# Altium footprint library circuits integres.PcbLib: 97 footprints (part 2 of 7)
Each footprint in its own frame and in the unit in brackets; x right, y up, seen from the top. Pads: shape width x height; smd on the part's side, far side on the other; paste and mask are expansions set on the pad; w line width, h text height; cw(c..) or ccw(c..) is an arc to the next point about the centre after c.
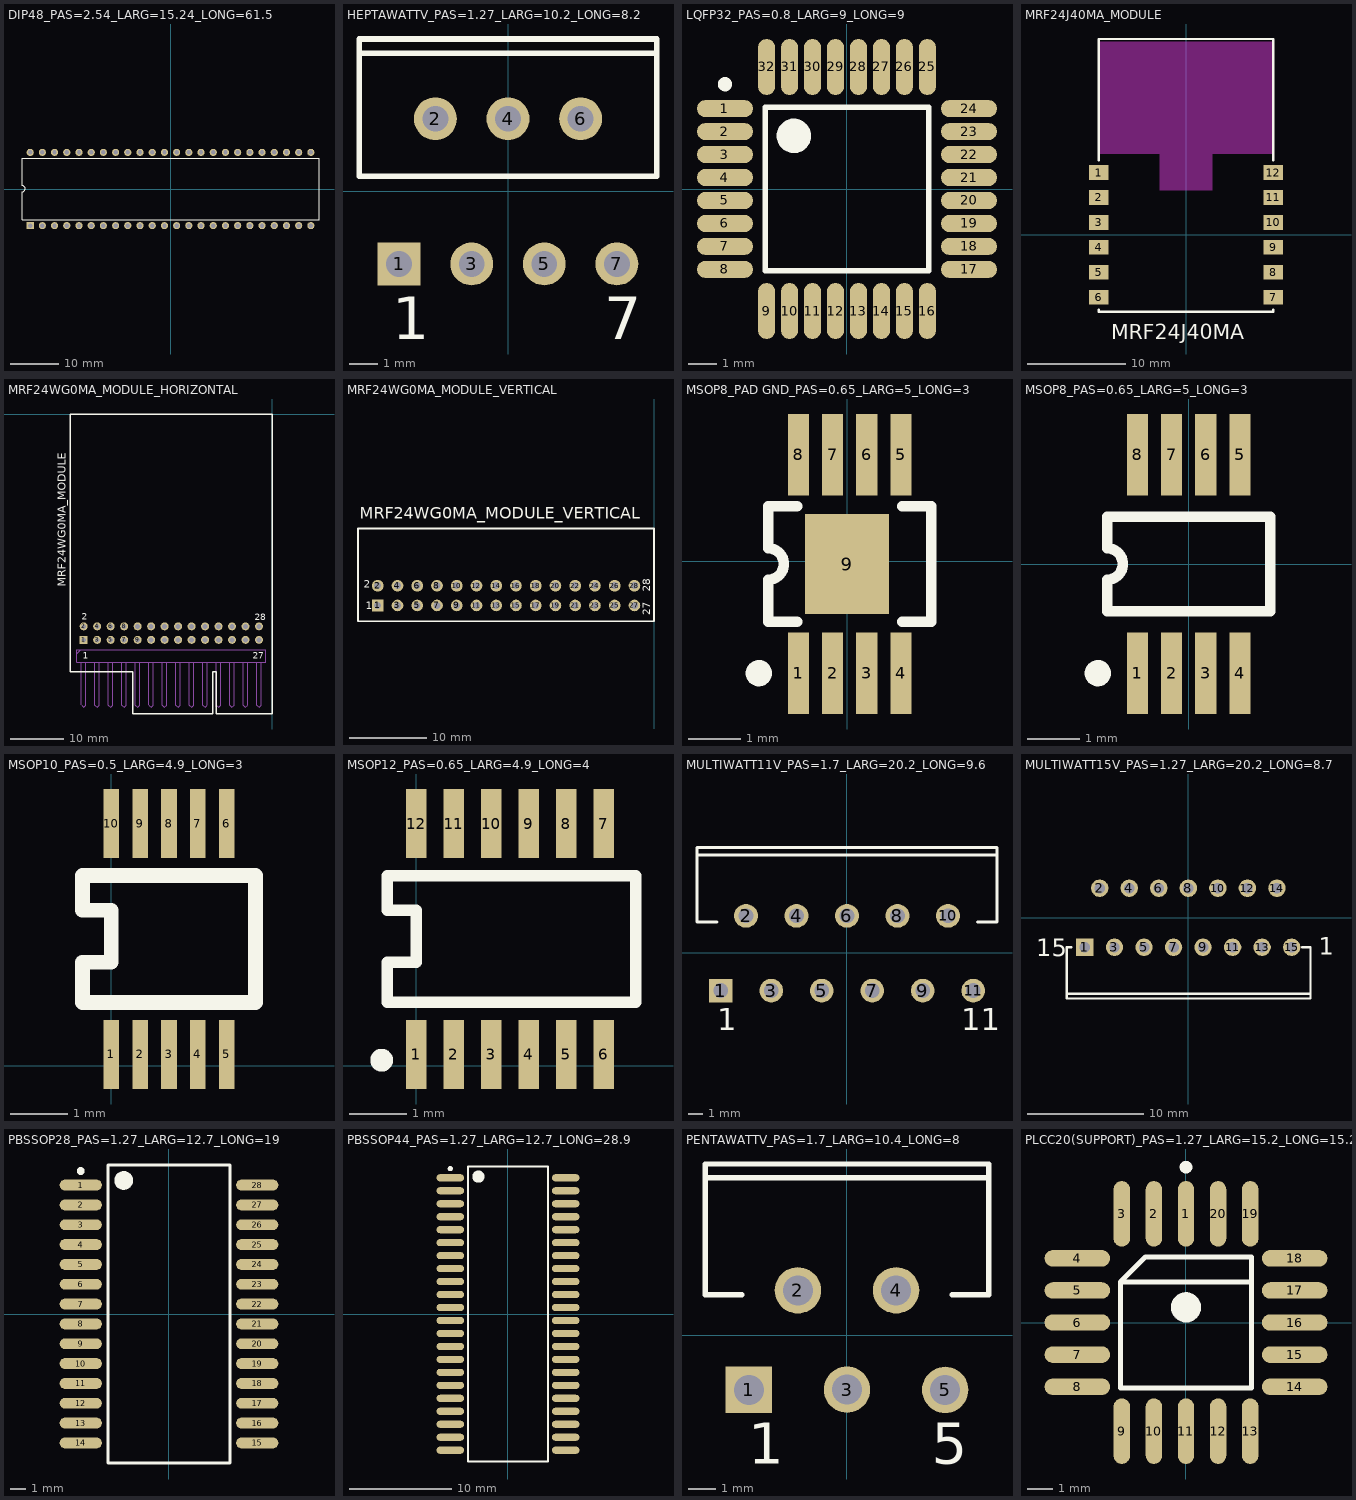
[diagram p1: the footprints below, top view; thin cyan lines are the x and y axes]

## DIP48_PAS=2.54_LARG=15.24_LONG=61.5 [mm] "Dual-In-Line Plastic Packages (PDIP) ; 48 Leads ; Row Spacing = 15.24 mm ; Pitch = 2.54 mm"
height 5
pads (48):
  rect 1.5x1.5 hole 0.9: 1(-29.21,-7.62)
  round 1.5 hole 0.9: 2(-26.67,-7.62) 3(-24.13,-7.62) 4(-21.59,-7.62) 5(-19.05,-7.62) 6(-16.51,-7.62) 7(-13.97,-7.62) 8(-11.43,-7.62) 9(-8.89,-7.62) 10(-6.35,-7.62) 11(-3.81,-7.62) 12(-1.27,-7.62) 13(1.27,-7.62) 14(3.81,-7.62) 15(6.35,-7.62) 16(8.89,-7.62) 17(11.43,-7.62) 18(13.97,-7.62) 19(16.51,-7.62) 20(19.05,-7.62) 21(21.59,-7.62) 22(24.13,-7.62) 23(26.67,-7.62) 24(29.21,-7.62) 25(29.21,7.62) 26(26.67,7.62) 27(24.13,7.62) 28(21.59,7.62) 29(19.05,7.62) 30(16.51,7.62) 31(13.97,7.62) 32(11.43,7.62) 33(8.89,7.62) 34(6.35,7.62) 35(3.81,7.62) 36(1.27,7.62) 37(-1.27,7.62) 38(-3.81,7.62) 39(-6.35,7.62) 40(-8.89,7.62) 41(-11.43,7.62) 42(-13.97,7.62) 43(-16.51,7.62) 44(-19.05,7.62) 45(-21.59,7.62) 46(-24.13,7.62) 47(-26.67,7.62) 48(-29.21,7.62)
Top Overlay:
  lines w0.2: -30.9,-6.45 30.9,-6.45 30.9,6.45 -30.9,6.45 -30.9,1.285 -30.9,0.7 cw(c-30.9,0.065) -30.9,-0.57 -30.9,-1.285 -30.9,-6.45
3D body: height 4.66, standoff -3.28, extent -30.745,-7.82 30.745,7.8

## HEPTAWATTV_PAS=1.27_LARG=10.2_LONG=8.2 [mm] "TO ; Thru-Hole ; Vertical ; Heatsink Mounted ; 7 Bent Staggered Leads ; Pitch = 1.27 mm"
height 20.2
pads (7):
  rect 1.5x1.5 hole 0.9: 1(-3.81,-2.54)
  round 1.5 hole 0.9: 2(-2.54,2.54) 3(-1.27,-2.54) 4(0,2.54) 5(1.27,-2.54) 6(2.54,2.54) 7(3.81,-2.54)
Top Overlay:
  lines w0.2: -5.2,4.83 5.2,4.83 ; -5.2,0.53 5.2,0.53 5.2,5.33 -5.2,5.33 -5.2,0.53
  text "7" at 3.37,-5.165 h1.5
  text "1" at -4.05,-5.165 h1.5
3D body: height 19.5, standoff -1.7, extent -5.1,-2.89 5.1,5.29

## LQFP32_PAS=0.8_LARG=9_LONG=9 [mm] "Low Plastic Quad Flatpack Packages ; 32 Leads ; Body 7mm x 7mm ; Pitch = 0.8mm ; IPC Low Density"
height 1.6
pads (32):
  oval 1.95x0.6 smd: 1(-4.25,2.8) 2(-4.25,2) 3(-4.25,1.2) 4(-4.25,0.4) 5(-4.25,-0.4) 6(-4.25,-1.2) 7(-4.25,-2) 8(-4.25,-2.8) 17(4.25,-2.8) 18(4.25,-2) 19(4.25,-1.2) 20(4.25,-0.4) 21(4.25,0.4) 22(4.25,1.2) 23(4.25,2) 24(4.25,2.8)
  oval 0.6x1.95 smd: 9(-2.8,-4.25) 10(-2,-4.25) 11(-1.2,-4.25) 12(-0.4,-4.25) 13(0.4,-4.25) 14(1.2,-4.25) 15(2,-4.25) 16(2.8,-4.25) 25(2.8,4.25) 26(2,4.25) 27(1.2,4.25) 28(0.4,4.25) 29(-0.4,4.25) 30(-1.2,4.25) 31(-2,4.25) 32(-2.8,4.25)
Top Overlay:
  circle w0.25: c-4.25,3.65 r0.125
  circle w0.6: c-1.85,1.85 r0.3
  lines w0.2: -2.85,-2.85 -2.85,2.85 2.85,2.85 2.85,-2.85 -2.85,-2.85
3D body: height 1.53, standoff -0.19, extent -4.5,-4.5 4.5,4.5

## MRF24J40MA_MODULE [mm]
pads (12):
  rect 2x1.5 smd: 1(-8.89,6.35) 2(-8.89,3.81) 3(-8.89,1.27) 4(-8.89,-1.27) 5(-8.89,-3.81) 6(-8.89,-6.35) 7(8.89,-6.35) 8(8.89,-3.81) 9(8.89,-1.27) 10(8.89,1.27) 11(8.89,3.81) 12(8.89,6.35)
Top Overlay:
  lines w0.254: -8.89,-7.62 -8.89,-7.85 8.89,-7.85 8.89,-7.62 ; -8.89,7.62 -8.89,19.95 8.89,19.95 8.89,7.62
  text "MRF24J40MA" at -7.6,-10.6 h1.52
Keep-Out Layer:
  rectangle: -2.7,4.5 2.7,9.525
  rectangle: -8.89,8.255 8.89,19.685
3D body: height 1.7, standoff 0, extent -8.891,-7.874 8.891,20.066

## MRF24WG0MA_MODULE_HORIZONTAL [mm]
height 5
pads (28):
  rect 1.5x1.5 hole 0.9: 1(-35.5,-42.54)
  round 1.5 hole 0.9: 2(-35.5,-40) 3(-32.96,-42.54) 4(-32.96,-40) 5(-30.42,-42.54) 6(-30.42,-40) 7(-27.88,-42.54) 8(-27.88,-40) 9(-25.34,-42.54) 10(-25.34,-40) 11(-22.8,-42.54) 12(-22.8,-40) 13(-20.26,-42.54) 14(-20.26,-40) 15(-17.72,-42.54) 16(-17.72,-40) 17(-15.18,-42.54) 18(-15.18,-40) 19(-12.64,-42.54) 20(-12.64,-40) 21(-10.1,-42.54) 22(-10.1,-40) 23(-7.56,-42.54) 24(-7.56,-40) 25(-5.02,-42.54) 26(-5.02,-40) 27(-2.48,-42.54) 28(-2.48,-40)
Top Overlay:
  lines w0.254: -38,-48.5 -26.3,-48.5 -26.3,-56.5 -11.23,-56.5 -11.23,-48.5 -10.5,-48.5 -10.5,-56.5 0,-56.5 0,0 -38,0 -38,-48.5
  text "2" at -35.9,-38.74 h1.27
  text "1" at -35.7,-46.14 h1.27
  text "27" at -3.7,-46.14 h1.27
  text "28" at -3.3,-38.84 h1.27
  text "MRF24WG0MA_MODULE" at -38.862,-32.512 h1.52
Mechanical 1:
  lines w0.2: -36.77,-45.145 -36.135,-44.51 ; -35.923,-54.8 -35.923,-46.74 ; -35.903,-54.84 -35.497,-55.247 -35.077,-54.827 -35.077,-46.74 ; -33.383,-46.74 -33.383,-54.867 -32.975,-55.275 -32.537,-54.837 -32.537,-46.84 ; -30.843,-46.74 -30.843,-54.8 -30.843,-54.857 -30.425,-55.275 -29.997,-54.847 -29.997,-46.74 ; -28.303,-46.74 -28.303,-54.84 -27.88,-55.263 -27.457,-54.84 -27.457,-46.74 ; -25.763,-46.74 -25.763,-54.83 -25.33,-55.263 -24.917,-54.85 -24.917,-46.74 ; -23.223,-54.8 -23.223,-46.74 ; -23.203,-54.84 -22.78,-55.263 -22.377,-54.86 -22.377,-46.74 ; -20.683,-46.74 -20.683,-54.8 -20.683,-54.86 -20.28,-55.263 -19.837,-54.82 -19.837,-46.74 ; -18.143,-46.74 -18.143,-54.85 -17.73,-55.263 -17.297,-54.83 -17.297,-46.74 ; -15.603,-46.74 -15.603,-54.84 -15.18,-55.263 -14.757,-54.84 -14.757,-46.74 ; -13.063,-46.74 -13.063,-54.83 -12.63,-55.263 -12.207,-54.84 ; -12.217,-54.8 -12.217,-46.74 ; -10.523,-55 -10.523,-46.74 ; -10.503,-54.84 -10.08,-55.263 -9.677,-54.86 -9.677,-46.74 ; -7.983,-46.74 -7.983,-54.86 -7.58,-55.263 -7.137,-54.82 -7.137,-46.74 ; -5.443,-46.74 -5.443,-54.85 -5.03,-55.263 -4.6,-54.833 ; -4.597,-54.797 -4.597,-46.74 ; -2.903,-54.85 -2.903,-46.74 ; -2.903,-54.84 -2.48,-55.263 -2.057,-54.84 ; -2.057,-54.85 -2.057,-46.74 ; -36.77,-46.74 -1.21,-46.74 -1.21,-44.44 -36.77,-44.44 -36.77,-46.74
3D body: height 5.64, standoff -2.23, extent -36.8,-52.44 -1.24,-39.676

## MRF24WG0MA_MODULE_VERTICAL [mm]
height 5
pads (28):
  rect 1.5x1.5 hole 0.9: 1(-35.56,-42.672)
  round 1.5 hole 0.9: 2(-35.56,-40.132) 3(-33.02,-42.672) 4(-33.02,-40.132) 5(-30.48,-42.672) 6(-30.48,-40.132) 7(-27.94,-42.672) 8(-27.94,-40.132) 9(-25.4,-42.672) 10(-25.4,-40.132) 11(-22.86,-42.672) 12(-22.86,-40.132) 13(-20.32,-42.672) 14(-20.32,-40.132) 15(-17.78,-42.672) 16(-17.78,-40.132) 17(-15.24,-42.672) 18(-15.24,-40.132) 19(-12.7,-42.672) 20(-12.7,-40.132) 21(-10.16,-42.672) 22(-10.16,-40.132) 23(-7.62,-42.672) 24(-7.62,-40.132) 25(-5.08,-42.672) 26(-5.08,-40.132) 27(-2.54,-42.672) 28(-2.54,-40.132)
Top Overlay:
  lines w0.254: -38.1,-44.704 -38.1,-32.766 0,-32.766 0,-44.704 -38.1,-44.704
  text "2" at -37.338,-40.386 h1
  text "28" at -0.508,-40.894 h1
  text "1" at -37.084,-43.18 h1
  text "27" at -0.508,-43.942 h1
  text "MRF24WG0MA_MODULE_VERTICAL" at -37.846,-31.496 h1.52

## MSOP8_PAD GND_PAS=0.65_LARG=5_LONG=3 [mm] "Mini Small Outline Plastic Package ; 8 Leads ; Body Width = 3 mm ; Pitch = 0.65 mm"
height 1.1
pads (9):
  rect 0.4x1.55 smd: 1(-0.925,-2.125) 2(-0.275,-2.125) 3(0.375,-2.125) 4(1.025,-2.125) 5(1.025,2.025) 6(0.375,2.025) 7(-0.275,2.025) 8(-0.925,2.025)
  rect 1.6x1.9 smd: 9(0,-0.05)
Top Overlay:
  circle w0.25: c-1.675,-2.125 r0.125
  lines w0.2: -0.95,-1.15 -1.5,-1.15 -1.5,-0.35 ccw(c-1.5,-0.05) -1.5,0.25 -1.5,1.05 -0.95,1.05 ; 1.05,-1.15 1.6,-1.15 1.6,1.05 1.05,1.05
3D body: height 1.09, standoff -0.01, extent -1.45,-2.55 1.55,2.45

## MSOP8_PAS=0.65_LARG=5_LONG=3 [mm] "Mini Small Outline Plastic Package ; 8 Leads ; Body Width = 3 mm ; Pitch = 0.65 mm"
height 1.1
pads (8):
  rect 0.4x1.55 smd: 1(-0.975,-2.075) 2(-0.325,-2.075) 3(0.325,-2.075) 4(0.975,-2.075) 5(0.975,2.075) 6(0.325,2.075) 7(-0.325,2.075) 8(-0.975,2.075)
Top Overlay:
  circle w0.25: c-1.725,-2.075 r0.125
  lines w0.2: -1.55,-0.9 1.55,-0.9 1.55,0.9 -1.55,0.9 -1.55,0.3 cw(c-1.55,0) -1.55,-0.3 -1.55,-0.9
3D body: height 1.09, standoff -0.01, extent -1.5,-2.5 1.5,2.5

## MSOP10_PAS=0.5_LARG=4.9_LONG=3 [mm] "Mini Small Outline Plastic Package ; 10 Leads ; Body Width = 3 mm ; Pitch = 0.5 mm"
height 1.1
pads (10):
  rect 0.27x1.2 smd: 1(0,0.2) 2(0.5,0.2) 3(1,0.2) 4(1.5,0.2) 5(2,0.2) 6(2,4.2) 7(1.5,4.2) 8(1,4.2) 9(0.5,4.2) 10(0,4.2)
Top Overlay:
  lines w0.254: 0,2.7 0,1.8 -0.5,1.8 -0.5,1.7 -0.5,1.1 2.5,1.1 2.5,3.3 -0.5,3.3 -0.5,2.7 0,2.7 ; 0,2.7 0,2.7
3D body: height 1.15, standoff 0, extent -0.5,-0.25 2.5,4.65

## MSOP12_PAS=0.65_LARG=4.9_LONG=4 [mm] "Mini Small Outline Plastic Packages ; 12 Leads ; Body Width = 3 mm ; Pitch = 0.65 mm"
height 1.1
pads (12):
  rect 0.35x1.2 smd: 1(0,0.2) 2(0.65,0.2) 3(1.3,0.2) 4(1.95,0.2) 5(2.6,0.2) 6(3.25,0.2) 7(3.25,4.2) 8(2.6,4.2) 9(1.95,4.2) 10(1.3,4.2) 11(0.65,4.2) 12(0,4.2)
Top Overlay:
  circle w0.254: c-0.6,0.1 r0.071
  lines w0.2: 0,2.7 -0.5,2.7 -0.5,3.3 3.8,3.3 3.8,1.1 -0.5,1.1 -0.5,1.7 -0.5,1.8 0,1.8 0,2.7 ; 0,2.7 0,2.7
3D body: height 1.1, standoff 0, extent -0.39,-0.25 3.65,4.65

## MULTIWATT11V_PAS=1.7_LARG=20.2_LONG=9.6 [mm] "TO , Thru-Hole , Vertical , Heatsink Mounted ; 11 Bent Staggered Leads ; Pitch = 1.7 mm ; Row Spacing = 5 mm"
height 21
pads (11):
  rect 1.6x1.6 hole 1: 1(-8.5,-2.54)
  round 1.6 hole 1: 2(-6.8,2.5) 3(-5.1,-2.54) 4(-3.4,2.5) 5(-1.7,-2.54) 6(0,2.5) 7(1.7,-2.54) 8(3.4,2.5) 9(5.1,-2.54) 10(6.8,2.5) 11(8.5,-2.54)
Top Overlay:
  lines w0.2: -10.1,6.59 10.1,6.59 ; -8.754,2.09 -10.1,2.09 -10.1,7.09 10.1,7.09 10.1,2.09 8.774,2.09
  text "11" at 7.69,-5.215 h1.5
  text "1" at -8.73,-5.215 h1.5
3D body: height 21.79, standoff -2.3, extent -10.1,-2.8 10.1,6.82

## MULTIWATT15V_PAS=1.27_LARG=20.2_LONG=8.7 [mm] "TO, Thru-Hole, Vertical, Heatsink Mounted ; 15 Bent Staggered Leads ; Pitch = 1.27 mm ; Row Spacing = 5.1 mm"
height 21
pads (15):
  rect 1.5x1.5 hole 0.9: 1(-8.89,-2.54)
  round 1.5 hole 0.9: 2(-7.62,2.54) 3(-6.35,-2.54) 4(-5.08,2.54) 5(-3.81,-2.54) 6(-2.54,2.54) 7(-1.27,-2.54) 8(0,2.54) 9(1.27,-2.54) 10(2.54,2.54) 11(3.81,-2.54) 12(5.08,2.54) 13(6.35,-2.54) 14(7.62,2.54) 15(8.89,-2.54)
Top Overlay:
  lines w0.2: -10.45,-6.55 10.45,-6.55 ; -10.05,-2.55 -10.45,-2.55 -10.45,-6.95 10.5,-6.95 10.5,-2.55 9.8,-2.55
  text "15" at -13.1,-3.3 h1.5
  text "1" at 11.2,-3.2 h1.5
3D body: height 21.5, standoff -3.5, extent -10.05,-6.25 10.15,2.62

## PBSSOP28_PAS=1.27_LARG=12.7_LONG=19 [mm] "Plastic Battery Snaphat Small Outline Package ; 28 Leads ; Body Width = 10 mm ; Pitch = 1.27 mm ; IPC Low Density"
height 3.05
pads (28):
  oval 2.7x0.7 smd: 1(-5.65,8.255) 2(-5.65,6.985) 3(-5.65,5.715) 4(-5.65,4.445) 5(-5.65,3.175) 6(-5.65,1.905) 7(-5.65,0.635) 8(-5.65,-0.635) 9(-5.65,-1.905) 10(-5.65,-3.175) 11(-5.65,-4.445) 12(-5.65,-5.715) 13(-5.65,-6.985) 14(-5.65,-8.255) 15(5.65,-8.255) 16(5.65,-6.985) 17(5.65,-5.715) 18(5.65,-4.445) 19(5.65,-3.175) 20(5.65,-1.905) 21(5.65,-0.635) 22(5.65,0.635) 23(5.65,1.905) 24(5.65,3.175) 25(5.65,4.445) 26(5.65,5.715) 27(5.65,6.985) 28(5.65,8.255)
Top Overlay:
  circle w0.6: c-2.9,8.55 r0.3
  circle w0.25: c-5.65,9.155 r0.125
  lines w0.2: -3.9,-9.55 3.9,-9.55 3.9,9.55 -3.9,9.55 -3.9,-9.55
3D body: height 3.05, standoff 0, extent -5.015,-9.525 5.015,9.525

## PBSSOP44_PAS=1.27_LARG=12.7_LONG=28.9 [mm] "Plastic Battery Snaphat Small Outline Package ; 44 Leads ; Body Width = 9 mm ; Pitch = 1.27 mm ; IPC Low Density"
height 3.05
pads (44):
  oval 2.7x0.7 smd: 1(-5.65,13.335) 2(-5.65,12.065) 3(-5.65,10.795) 4(-5.65,9.525) 5(-5.65,8.255) 6(-5.65,6.985) 7(-5.65,5.715) 8(-5.65,4.445) 9(-5.65,3.175) 10(-5.65,1.905) 11(-5.65,0.635) 12(-5.65,-0.635) 13(-5.65,-1.905) 14(-5.65,-3.175) 15(-5.65,-4.445) 16(-5.65,-5.715) 17(-5.65,-6.985) 18(-5.65,-8.255) 19(-5.65,-9.525) 20(-5.65,-10.795) 21(-5.65,-12.065) 22(-5.65,-13.335) 23(5.65,-13.335) 24(5.65,-12.065) 25(5.65,-10.795) 26(5.65,-9.525) 27(5.65,-8.255) 28(5.65,-6.985) 29(5.65,-5.715) 30(5.65,-4.445) 31(5.65,-3.175) 32(5.65,-1.905) 33(5.65,-0.635) 34(5.65,0.635) 35(5.65,1.905) 36(5.65,3.175) 37(5.65,4.445) 38(5.65,5.715) 39(5.65,6.985) 40(5.65,8.255) 41(5.65,9.525) 42(5.65,10.795) 43(5.65,12.065) 44(5.65,13.335)
Top Overlay:
  circle w0.6: c-2.9,13.45 r0.3
  circle w0.25: c-5.65,14.235 r0.125
  lines w0.2: -3.9,-14.45 3.9,-14.45 3.9,14.45 -3.9,14.45 -3.9,-14.45
3D body: height 3.05, standoff 0, extent -4.445,-14.435 4.445,14.435

## PENTAWATTV_PAS=1.7_LARG=10.4_LONG=8 [mm] "TO , Thru-Hole , Vertical , Heatsink Mounted ; 5 Bent Staggered Leads ; Pitch = 1.7 mm ; Row Spacing = 3.6 mm"
height 21.2
pads (5):
  rect 1.7x1.7 hole 1.1: 1(-3.6,-2)
  round 1.7 hole 1.1: 2(-1.8,1.65) 3(0,-1.99) 4(1.8,1.65) 5(3.6,-2)
Top Overlay:
  lines w0.2: -5.2,5.78 5.2,5.78 ; -3.854,1.48 -5.2,1.48 -5.2,6.28 5.2,6.28 5.2,1.48 3.854,1.48
  text "5" at 3.1,-4.7 h1.5
  text "1" at -3.62,-4.715 h1.5
3D body: height 20.78, standoff -4.52, extent -5.2,-2.187 5.2,5.887

## PLCC20(SUPPORT)_PAS=1.27_LARG=15.2_LONG=15.2 [mm] "Plastic Leaded Chip Carrier Packages ; 20 Leads ; Body : 15.2 mm x 15.2 mm ; Pitch = 1.27 mm ; IPC Low Density"
height 4.57
pads (20):
  oval 0.65x2.6 smd: 1(0,4.3) 2(-1.27,4.3) 3(-2.54,4.3) 9(-2.54,-4.3) 10(-1.27,-4.3) 11(0,-4.3) 12(1.27,-4.3) 13(2.54,-4.3) 19(2.54,4.3) 20(1.27,4.3)
  oval 2.6x0.65 smd: 4(-4.3,2.54) 5(-4.3,1.27) 6(-4.3,0) 7(-4.3,-1.27) 8(-4.3,-2.54) 14(4.3,-2.54) 15(4.3,-1.27) 16(4.3,0) 17(4.3,1.27) 18(4.3,2.54)
Top Overlay:
  circle w0.6: c0,0.6 r0.3
  circle w0.25: c0,6.15 r0.125
  lines w0.2: 2.6,1.6 -2.6,1.6 ; -2.6,1.6 -2.6,-2.6 2.6,-2.6 2.6,2.6 -1.6,2.6 -2.6,1.6
3D body: height 5.13, standoff -1.78, extent -7.6,-7.62 7.64,7.62